# Altium footprint library CMR_Connectors.PcbLib: 71 footprints (part 3 of 5)
Each footprint in its own frame and in the unit in brackets; x right, y up, seen from the top. Pads: shape width x height; smd on the part's side, far side on the other; paste and mask are expansions set on the pad; w line width, h text height; cw(c..) or ccw(c..) is an arc to the next point about the centre after c.
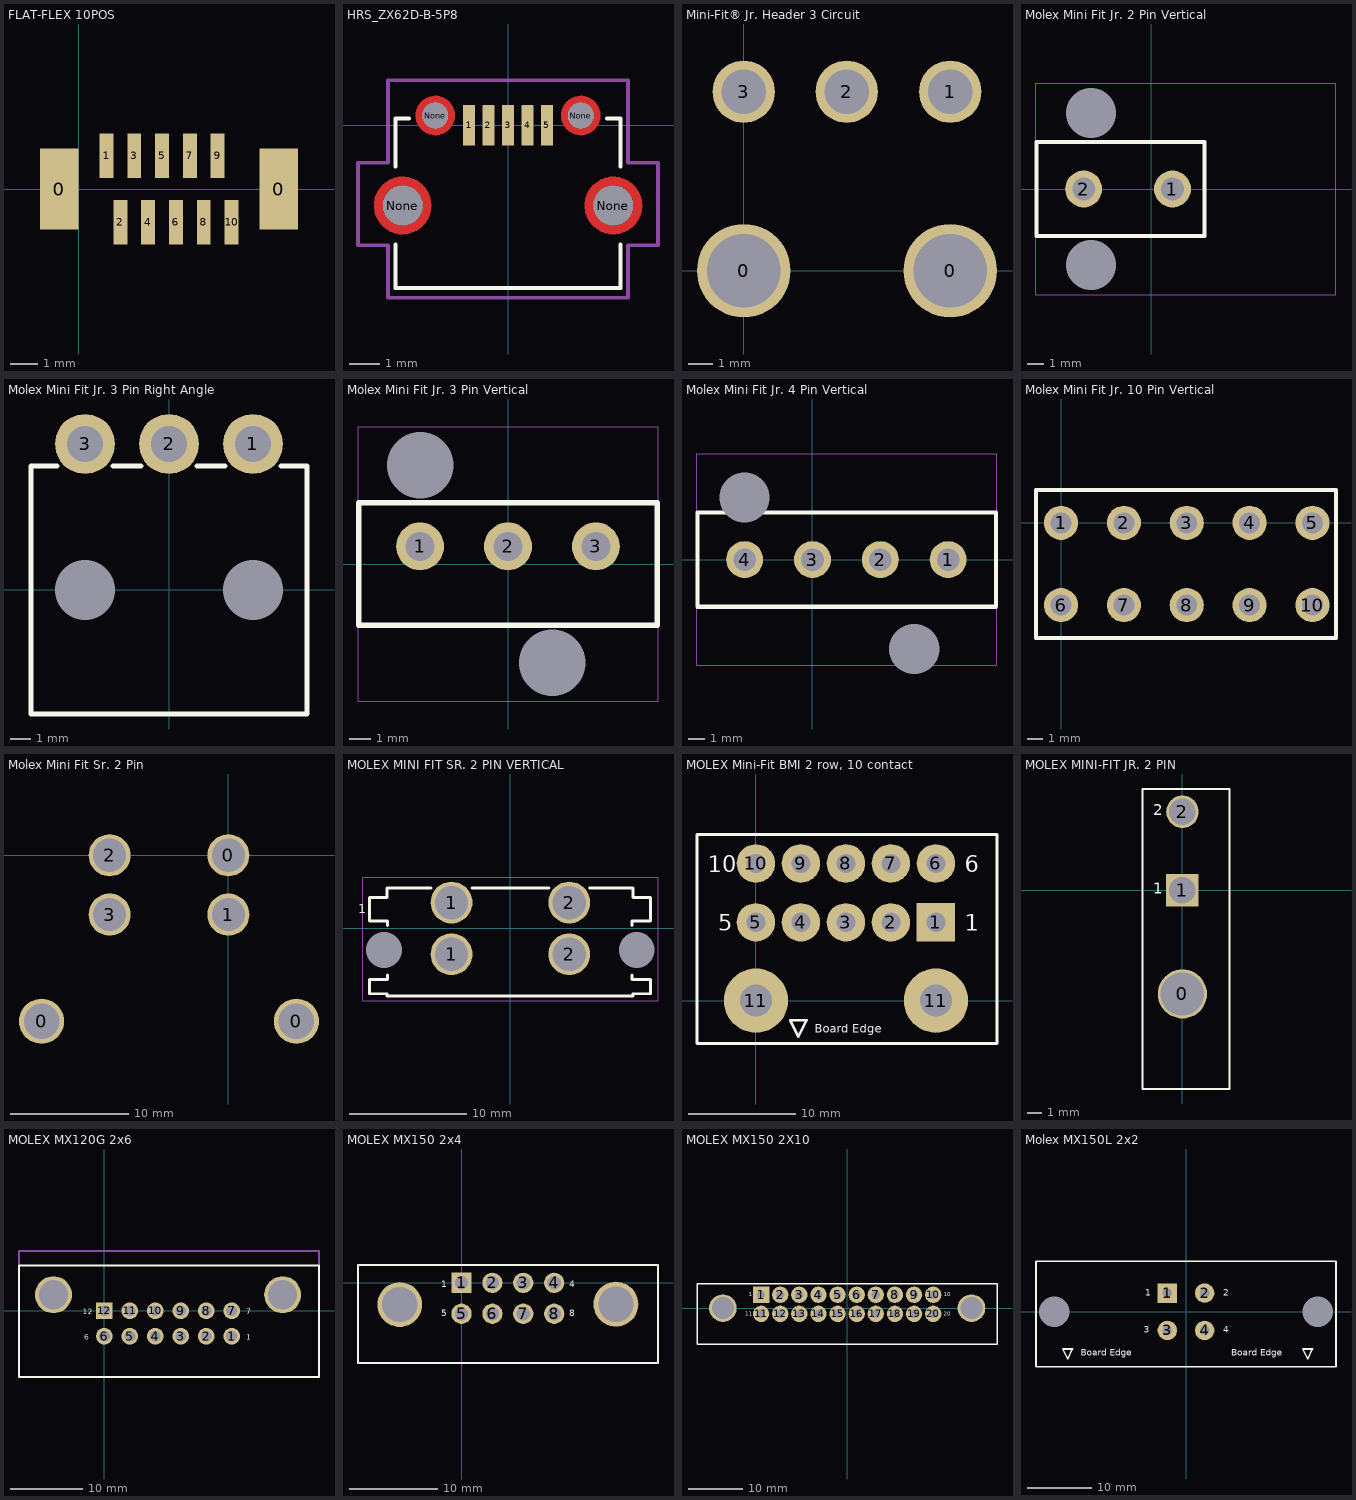
[diagram p2: the footprints below, top view; thin cyan lines are the x and y axes]

## FLAT-FLEX 10POS [mm] "10 Position FPC Connector Contacts, Vertical, 1 Sided 0.020\" (0.50mm) Surface Mount"
pads (12):
  rect 1.4x2.9 smd: 0(-0.7,0) 0(7.2,0)
  rect 0.5x1.6 smd: 1(1,1.2) 2(1.5,-1.2) 3(2,1.2) 4(2.5,-1.2) 5(3,1.2) 6(3.5,-1.2) 7(4,1.2) 8(4.5,-1.2) 9(5,1.2) 10(5.5,-1.2)
3D body "XF2J_1024_11A.step": height 4.15, standoff 0, extent -1.499,-1.672 8.001,1.778

## HRS_ZX62D-B-5P8 [mm]
pads (12):
  rect 0.4x1.35 smd: 1(-1.3,0) 2(-0.65,0) 3(0,0) 4(0.65,0) 5(1.3,0)
  rect 0.1x0.1 smd mask+0: 6(3.512,-2.675) 7(-2.425,0.325) 7(2.425,0.325)
  round 1.321 hole 1.321: None(-3.512,-2.675) None(3.512,-2.675)
  round 0.864 hole 0.864: None(-2.425,0.325) None(2.425,0.325)
Top Layer:
  circle w0.305: c-3.512,-2.675 r0.813
  circle w0.305: c3.512,-2.675 r0.813
  circle w0.305: c-2.425,0.325 r0.508
  circle w0.305: c2.425,0.325 r0.508
Top Overlay:
  lines w0.127: -3.75,-3.975 -3.75,-5.425 3.75,-5.425 3.75,-3.975 ; -3.75,-1.375 -3.75,0.225 -3.3,0.225 ; 3.3,0.225 3.75,0.225 3.75,-1.375
Mechanical 1:
  lines w0.127: -5,-4 -4,-4 -4,-5.75 4,-5.75 4,-4 5,-4 5,-1.25 4,-1.25 4,1.5 -4,1.5 -4,-1.25 -5,-1.25 -5,-4

## Mini-Fit® Jr. Header 3 Circuit [mil] "Mini-Fit® Jr. Header, Single Row, Right Angle, with Snap-in Plastic Peg PCB Lock, 3 Circuits, PA Polyamide Nylon 6/6, 94V-0, Tin (Sn) Plating"
pads (5):
  round 150 hole 118: 0(0,0) 0(331,0)
  round 100 hole 71: 1(331,287) 2(165,287) 3(0,287)
3D body "039014030.stp": height 391.73, standoff -9.84, extent -105.32,-1066.93 437.99,-255.91
3D body "039303036.stp": height 285.46, standoff -139.73, extent -106,-247.57 437.31,305.57

## Molex Mini Fit Jr. 2 Pin Vertical [mm] "Molex Mini Fit Jr. 2 Pin Vertical"
pads (4):
  round 0 hole 3.1 unplated: 0(-3.74,-4.7) 0(-3.74,4.7)
  round 2.286 hole 1.4: 1(1.3,0) 2(-4.2,0)
Top Overlay:
  lines w0.254: -7.112,-2.921 3.275,-2.921 3.275,2.921 -7.112,2.921 -7.112,-2.921
Mechanical 15:
  lines w0.02: -7.15,-6.55 2.25,-6.55 11.425,-6.55 11.425,6.55 -7.15,6.55 -7.15,-6.55
3D body "039299025.stp": height 12.8, standoff -3.5, extent -7.175,-6.064 3.825,6.114
3D body "039012020.stp": height 32.6, standoff 13, extent -10.125,-2.825 4.275,2.575

## Molex Mini Fit Jr. 3 Pin Right Angle [mm] "Mini-Fit® Jr. Header, Single Row, Right Angle, with Snap-in Plastic Peg PCB Lock, 3 Circuits, PA Polyamide Nylon 6/6, 94V-0, Tin (Sn) Plating"
pads (5):
  round 0 hole 3 unplated: 0(-4.2,0) 0(4.2,0)
  round 3 hole 1.8 unplated: 1(4.2,7.3) 2(0,7.3) 3(-4.2,7.3)
Top Overlay:
  lines w0.254: -5.6,6.2 -6.9,6.2 -6.9,-6.2 6.9,-6.2 6.9,6.2 5.6,6.2 ; -2.8,6.2 -1.4,6.2 ; 1.4,6.2 2.8,6.2
3D body "039014030.stp": height 9.65, standoff -0.55, extent -6.925,-26.9 6.875,-6.3
3D body "039303036.stp": height 7.2, standoff -3.6, extent -6.9,-6.25 6.9,7.8

## Molex Mini Fit Jr. 3 Pin Vertical [mil]
pads (5):
  round 0 hole 125 unplated: 0(-165,185) 0(83,-185)
  round 90 hole 55: 1(-165,33) 2(0,33) 3(165,33)
Top Overlay:
  lines w10: -280,-115 280,-115 280,115 -280,115 -280,-115
Mechanical 15:
  lines w0.79: -281.5,-257.87 88.58,-257.87 281.5,-257.87 281.5,257.87 -281.5,257.87 -281.5,-257.87
3D body "039014030.stp": height 1311.02, standoff 500, extent -271.65,-147.66 271.66,253.91
3D body "039302030.stp": height 490.16, standoff -137.8, extent -271.65,-229.52 271.66,225.54

## Molex Mini Fit Jr. 4 Pin Vertical [mm] "Molex Mini Fit Jr. 4 Pin Vertical"
pads (6):
  round 0 hole 3.1 unplated: 0(-4.2,3.85) 0(6.3,-5.55)
  round 2.286 hole 1.4: 1(8.4,0) 2(4.2,0) 3(0,0) 4(-4.2,0)
Top Overlay:
  lines w0.254: -7.112,-2.921 11.375,-2.921 11.375,2.921 -7.112,2.921 -7.112,-2.921
Mechanical 15:
  lines w0.02: -7.15,-6.55 2.25,-6.55 11.425,-6.55 11.425,6.55 -7.15,6.55 -7.15,-6.55
3D body "039014040.stp": height 32.7, standoff 13.1, extent -6.9,-4.513 11.1,5.687
3D body "039302042.stp": height 12.8, standoff -3.5, extent -6.9,-6.654 11.1,4.905

## Molex Mini Fit Jr. 10 Pin Vertical [mil]
pads (10):
  round 90 hole 55: 1(0,0) 2(165.35,0) 3(330.71,0) 4(496.06,0) 5(661.42,0) 6(0,-216.54) 7(165.35,-216.54) 8(330.71,-216.54) 9(496.06,-216.54) 10(661.42,-216.54)
Top Overlay:
  lines w10: -65.94,-303.15 723.43,-303.15 723.43,86.46 -65.94,86.46 -65.94,-303.15
3D body "039012100.stp": height 1326.77, standoff 555.12, extent -110.24,-323.82 763.78,243.11
3D body "039281103.stp": height 503.94, standoff -137.8, extent -125.98,-284.45 779.53,148.62

## Molex Mini Fit Sr. 2 Pin [mil]
pads (6):
  round 150 hole 118: 0(-620,-551) 0(226,-551)
  round 140 hole 110: 0(0,0) 1(0,-197) 2(-394,0) 3(-394,-197)
3D body "428160212.stp": height 622.05, standoff -425.2, extent -659.45,-2569.88 265.75,-1097.44
3D body "428202223.stp": height 551.66, standoff -200.31, extent -665,-1087.83 272.79,57.83

## MOLEX MINI FIT SR. 2 PIN VERTICAL [mil]
pads (6):
  round 0 hole 120 unplated: 0(-423,-72.5) 0(423,-72.5)
  round 140 hole 112: 1(-197,-86.5) 1(-197,86.5) 2(197,-86.5) 2(197,86.5)
Top Overlay:
  lines w10: -411.19,-155.18 -411.19,-171.42 -412.68,-171.42 -471.34,-171.42 -471.34,-218.67 -412.68,-218.67 -412.68,-226.54 -393,-226.54 -326.07,-226.54 323.54,-226.54 390.47,-226.54 410.15,-226.54 410.15,-218.67 468.81,-218.67 468.81,-171.42 410.15,-171.42 407.71,-171.42 407.71,-155.18 ; -411.19,10.18 -411.19,25.43 -412.68,25.43 -471.34,25.43 -471.34,104.17 -412.68,104.17 -412.68,135.66 -393,135.66 -265.52,135.66 ; -128.48,135.5 129,135.5 ; 265,135.66 390.47,135.66 410.15,135.66 410.15,104.17 468.81,104.17 468.81,25.43 410.15,25.43 407.71,25.43 407.71,10.18
  text "1" at -510,50 h30
Mechanical 15:
  lines w1.97: -494.09,-242.13 494.09,-242.13 494.09,171.26 -196.85,171.26 -494.09,171.26 -494.09,-242.13
3D body "428160212.stp": height 2322.83, standoff 850.39, extent -460.6,-709.74 464.6,337.5
3D body "428192213.stp": height 830.51, standoff -163.58, extent -470.16,-290.06 470,265.06

## MOLEX Mini-Fit BMI 2 row, 10 contact [mm]
pads (12):
  rect 3.6x3.6 hole 1.8: 1(16.8,7.3)
  round 3.6 hole 1.8: 2(12.6,7.3) 3(8.4,7.3) 4(4.2,7.3) 5(0,7.3) 6(16.8,12.8) 7(12.6,12.8) 8(8.4,12.8) 9(4.2,12.8) 10(0,12.8)
  round 6 hole 3: 11(0,0) 11(16.8,0)
Top Overlay:
  lines w0.254: -5.5,-4 -5.5,15.5 22.5,15.5 22.5,-4 -5.5,-4 ; 3.196,-1.842 3.958,-3.366 4.72,-1.842 3.196,-1.842
  text "10" at -4.5,12 h1.52
  text "5" at -3.5,6.5 h1.52
  text "6" at 19.5,12 h1.52
  text "1" at 19.5,6.5 h1.52
  text "Board Edge" at 5.5,-3 h0.8
3D body "015060100.stp": height 16.3, standoff -1, extent -17.875,-27.725 34.925,-8.125
3D body "015246100.stp": height 15, standoff -3.6, extent -5.3,-8.05 22.3,13.175

## MOLEX MINI-FIT JR. 2 PIN [mil] "Molex Mini-Fit Jr., Right Angle, TH, 2x1"
pads (3):
  round 136 hole 120: 0(0,-287)
  rect 90x90 hole 73: 1(0,0)
  round 90 hole 73: 2(0,217)
Top Overlay:
  lines w5: -110,-550 -110,280 130,280 130,-550 -110,-550
  text "2" at -80,207 h30
  text "1" at -80,-10 h30
3D body "039301022.stp": height 448.82, standoff -141.73, extent -106.17,-546.84 122.17,238
3D body "039012020.stp": height 561.02, standoff -5.91, extent -104.33,-1327.76 108.27,-556.1

## MOLEX MX120G 2x6 [mm]
pads (14):
  round 2.3 hole 1.5: 1(17.5,-3.5) 2(14,-3.5) 3(10.5,-3.5) 4(7,-3.5) 5(3.5,-3.5) 6(0,-3.5) 7(17.5,0) 8(14,0) 9(10.5,0) 10(7,0) 11(3.5,0)
  rect 2.3x2.3 hole 1.5: 12(0,0)
  round 5.08 hole 4: ""(-7,2.2) ""(24.5,2.2)
Top Overlay:
  lines w0.254: -11.732,-9.089 29.5,-9.089 29.5,6.2 -11.732,6.2 -11.732,-9.089
  text "1" at 19.5,-4 h0.76
  text "7" at 19.5,-0.5 h0.76
  text "6" at -2.75,-4 h0.76
  text "12" at -3,-0.5 h0.76
Mechanical 1:
  lines w0.254: -11.732,6.2 -11.732,8.2 29.5,8.2 29.5,6.2
  text "Place connector with board outline aligned with far edge of mechanical layer" at -11.43,-8.636 h0.25
3D body "367921201.stp": height 28.19, standoff 3.47, extent -9.252,29.106 26.45,59.044
3D body "367831201.stp": height 24.43, standoff -3.19, extent -9.929,-3.75 27.429,28.708

## MOLEX MX150 2x4 [mm]
pads (10):
  rect 2.3x2.3 hole 1.5: 1(0,0)
  round 2.3 hole 1.5: 2(3.5,0) 3(7,0) 4(10.5,0) 5(0,-3.5) 6(3.5,-3.5) 7(7,-3.5) 8(10.5,-3.5)
  round 5.08 hole 4: ""(-7,-2.46) ""(17.5,-2.409)
Top Overlay:
  lines w0.254: -11.732,-9.089 -11.732,2.032 22.268,2.032 22.268,-9.089 -11.732,-9.089
  text "8" at 12.192,-3.81 h0.76
  text "4" at 12.192,-0.508 h0.76
  text "5" at -2.286,-3.81 h0.76
  text "1" at -2.286,-0.508 h0.76
Mechanical 1:
  text "Place connector 40 mil from center of board outline to center of silkscreen" at -11.43,-8.636 h0.25
3D body "MX150-8pin.stp": height 21.03, standoff -5.46, extent -16.077,-41.969 26.613,0.591
3D body "334724806.stp": height 22.71, standoff -2.17, extent -8.659,-80.625 19.125,-43.625

## MOLEX MX150 2X10 [mm]
pads (22):
  rect 3x3 hole 1.5: 1(-15.75,2.46)
  round 3 hole 1.5: 2(-12.25,2.46) 3(-8.75,2.46) 4(-5.25,2.46) 5(-1.75,2.46) 6(1.75,2.46) 7(5.25,2.46) 8(8.75,2.46) 9(12.25,2.46) 10(15.75,2.46) 11(-15.75,-1.04) 12(-12.25,-1.04) 13(-8.75,-1.04) 14(-5.25,-1.04) 15(-1.75,-1.04) 16(1.75,-1.04) 17(5.25,-1.04) 18(8.75,-1.04) 19(12.25,-1.04) 20(15.75,-1.04)
  round 5.08 hole 4: ""(-22.75,0) ""(22.75,0)
Top Overlay:
  lines w0.254: -27.482,-6.629 -27.482,4.492 27.432,4.492 27.432,-6.629 -27.482,-6.629
  text "20" at 17.653,-1.397 h0.76
  text "10" at 17.653,2.159 h0.76
  text "11" at -18.669,-1.397 h0.76
  text "1" at -18.034,2.159 h0.76
Mechanical 1:
  text "Place connector 40 mil from center of board outline to center of silkscreen" at -27.18,-6.176 h0.25
3D body "348302001.stp": height 21.03, standoff -5.46, extent -31.845,-39.56 31.845,3
3D body "334722001.stp": height 23.45, standoff -1.41, extent -24.292,-77 24.492,-40

## Molex MX150L 2x2 [mm]
pads (6):
  rect 3.04x3.04 hole 1.52: 1(-2.921,2.921)
  round 3.04 hole 1.52: 2(2.921,2.921) 3(-2.921,-2.921) 4(2.921,-2.921)
  round 0 hole 4.78: ""(-20.625,0) ""(20.625,0)
Top Overlay:
  lines w0.254: -23.495,-8.611 -23.495,7.899 23.495,7.899 23.495,-8.611 -23.495,-8.611 ; -19.304,-5.842 -18.542,-7.366 -17.78,-5.842 -19.304,-5.842 ; 18.288,-5.842 19.812,-5.842 19.05,-7.366 18.288,-5.842
  text "Board Edge" at -16.51,-6.858 h1.02
  text "Board Edge" at 7.112,-6.858 h1.02
  text "1" at -6.35,2.54 h1.02
  text "2" at 5.842,2.54 h1.02
  text "3" at -6.604,-3.302 h1.02
  text "4" at 5.842,-3.302 h1.02
3D body "194320002.stp": height 34.85, standoff 4.73, extent -14.975,-77.019 15.375,-33.1
3D body "194270032.stp": height 31.71, standoff -3.9, extent -24.13,-31.699 24.13,7.95